# Altium footprint library TriggersLib.PcbLib: 262 footprints (part 17 of 17)
Each footprint in its own frame and in the unit in brackets; x right, y up, seen from the top. Pads: shape width x height; smd on the part's side, far side on the other; paste and mask are expansions set on the pad; w line width, h text height; cw(c..) or ccw(c..) is an arc to the next point about the centre after c.
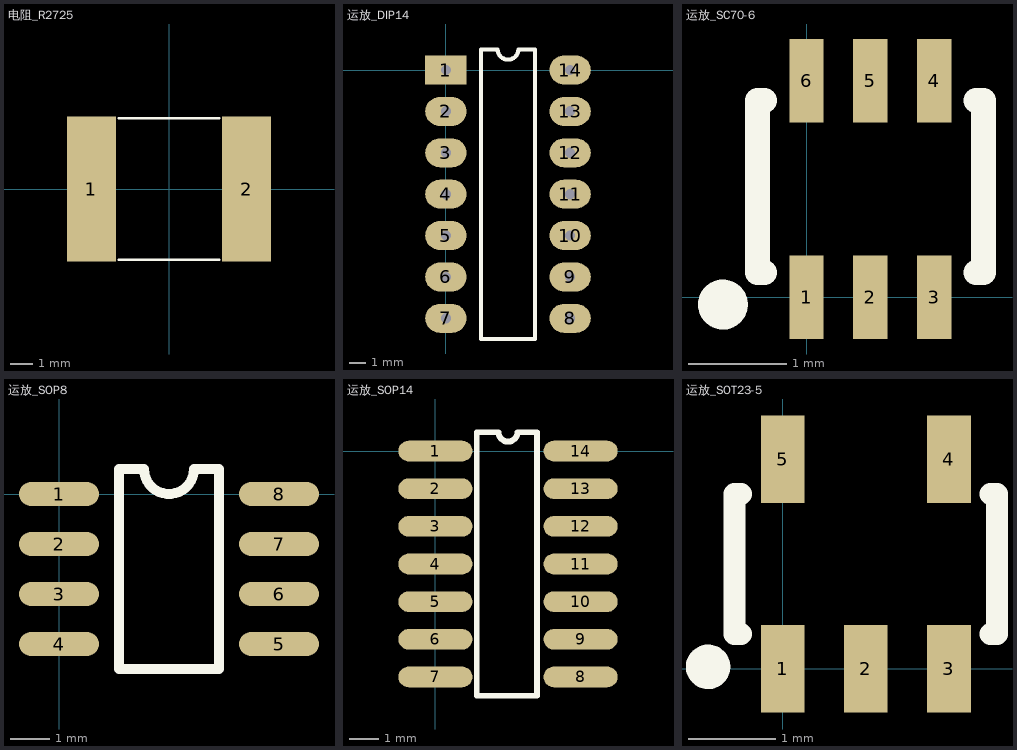
[diagram p16: the footprints below, top view; thin cyan lines are the x and y axes]

## 电阻_R2725 [mm]
pads (2):
  rect 2.15x6.35 smd: 1(-3.4,0) 2(3.4,0)
Top Overlay:
  lines w0.127: -2.2,-3.1 2.2,-3.1 ; -2.2,3.1 2.2,3.1

## 运放_DIP14 [mil]
pads (14):
  rect 100x70 hole 25: 1(0,0)
  oval 100x70 hole 25: 2(0,-100) 3(0,-200) 4(0,-300) 5(0,-400) 6(0,-500) 7(0,-600) 8(300,-600) 9(300,-500) 10(300,-400) 11(300,-300) 12(300,-200) 13(300,-100) 14(300,0)
Top Overlay:
  lines w10: 85,-650 85,50 125,50 ccw(c150,50) 175,50 215,50 215,-650 85,-650
3D body "DIP14.STEP": height 164.96, standoff -116.93, extent 0,-679.92 300,79.92

## 运放_SC70-6 [mm]
pads (6):
  rect 0.35x0.85 smd: 1(0,0) 2(0.65,0) 3(1.3,0) 4(1.3,2.2) 5(0.65,2.2) 6(0,2.2)
Top Overlay:
  circle w0.254: c-0.85,-0.075 r0.127
  lines w0.254: -0.425,0.25 -0.5,0.25 -0.5,2 -0.425,2 ; 1.725,0.25 1.8,0.25 1.8,2 1.725,2

## 运放_SOP8 [mil]
pads (8):
  oval 80x24 smd: 1(0,0) 2(0,-50) 3(0,-100) 4(0,-150) 5(220,-150) 6(220,-100) 7(220,-50) 8(220,0)
Top Overlay:
  lines w10: 60,-175 160,-175 160,25 135,25 cw(c110,25) 85,25 60,25 60,-175
3D body "SOP8.STEP": height 62.99, standoff 0, extent -7.7,-172.62 230.17,25.02

## 运放_SOP14 [mm]
pads (14):
  oval 2.5x0.7 smd: 1(0,0) 2(0,-1.27) 3(0,-2.54) 4(0,-3.81) 5(0,-5.08) 6(0,-6.35) 7(0,-7.62) 8(4.9,-7.62) 9(4.9,-6.35) 10(4.9,-5.08) 11(4.9,-3.81) 12(4.9,-2.54) 13(4.9,-1.27) 14(4.9,0)
Top Overlay:
  lines w0.2: 1.397,-8.255 1.397,0.635 2.133,0.635 ccw(c2.45,0.635) 2.768,0.635 3.429,0.635 3.429,-8.255 1.397,-8.255

## 运放_SOT23-5 [mm]
pads (5):
  rect 0.5x1 smd: 1(0,0) 2(0.95,0) 3(1.9,0) 4(1.9,2.4) 5(0,2.4)
Top Overlay:
  circle w0.254: c-0.852,0.025 r0.127
  lines w0.254: -0.475,0.4 -0.55,0.4 -0.55,2 -0.475,2 ; 2.375,0.4 2.45,0.4 2.45,2 2.375,2
3D body "User Library-SOT23-5.STEP": height 1.09, standoff -0.01, extent -0.5,-0.201 2.399,2.599